# Altium integrated library LEMO Unipole And Multipole Type Connectors.IntLib: 1566 symbols (part 3 of 13) (continued)
## EEA.2B.304.CLN
designator J?
Fixed receptacle, nut fixing with straight contacts for printed circuit(back panel mounting), Key (A), 2B series, Multipole Type with 4 Contacts; Manufacturer: LEMO; PartNumber: EEA.2B.304.CLN; Number of contacts: 4; Contact Diameter: 1.3 mm; AWG: 20; Rated Current(A): 15; DatasheetVersion: Jun-14; PackageReference: EEA.2B.304.CLN; PackageDescription: Fixed receptacle, nut fixing with straight contacts for printed circuit(back panel mounting), Key(A) for Printed Circuit; ComponentLink1Description: Manufacturer URL; ComponentLink1URL: http://www.lemo.com; ComponentLink2Description: Datasheet; ComponentLink2URL: http://intra.lemo.ch/catalog/ROW/UK_English/unipole_multipole.pdf
footprint EEA.2B.304.CLN (Socket, Female, Body 15mm dia. Height 24.6 mm, Through hole)
pins: 1, 2, 3, 4

## EEA.2B.304.CLV
designator J?
Fixed receptacle, nut fixing with elbow contacts for printed circuit(back panel mounting), Key (A), 2B series, Multipole Type with 4 Contacts; Manufacturer: LEMO; PartNumber: EEA.2B.304.CLV; Number of contacts: 4; Contact Diameter: 1.3 mm; AWG: 20; Rated Current(A): 0; DatasheetVersion: Jun-14; PackageReference: EEA.2B.304.CLV; PackageDescription: Fixed receptacle, nut fixing with elbow contacts for printed circuit(back panel mounting), Key(A) for Printed Circuit; ComponentLink1Description: Manufacturer URL; ComponentLink1URL: http://www.lemo.com; ComponentLink2Description: Datasheet; ComponentLink2URL: http://intra.lemo.ch/catalog/ROW/UK_English/unipole_multipole.pdf
footprint EEA.2B.304.CLV (Socket, Female, Body 15mm dia. Height 24.6 mm, Through hole)
pins: 1, 2, 3, 4

## EEA.2B.308.CLN
designator J?
Fixed receptacle, nut fixing with straight contacts for printed circuit(back panel mounting), Key (A), 2B series, Multipole Type with 8 Contacts; Manufacturer: LEMO; PartNumber: EEA.2B.308.CLN; Number of contacts: 8; Contact Diameter: 0.9 mm; AWG: 22; Rated Current(A): 10; DatasheetVersion: Jun-14; PackageReference: EEA.2B.308.CLN; PackageDescription: Fixed receptacle, nut fixing with straight contacts for printed circuit(back panel mounting), Key(A) for Printed Circuit; Supplier 1: Mouser; Supplier Part Number 1: 736-EEA2B308CLN; Supplier 2: Digi-Key; Supplier Part Number 2: EEA.2B.308.CLN-ND; ComponentLink1Description: Manufacturer URL; ComponentLink1URL: http://www.lemo.com; ComponentLink2Description: Datasheet; ComponentLink2URL: http://intra.lemo.ch/catalog/ROW/UK_English/unipole_multipole.pdf
footprint EEA.2B.308.CLN (Socket, Female, Body 15mm dia. Height 24.6 mm, Through hole)
pins: 1, 2, 3, 4, 5, 6, 7, 8

## EEA.2B.310.CLN
designator J?
Fixed receptacle, nut fixing with straight contacts for printed circuit(back panel mounting), Key (A), 2B series, Multipole Type with 10 Contacts; Manufacturer: LEMO; PartNumber: EEA.2B.310.CLN; Number of contacts: 10; Contact Diameter: 0.9 mm; AWG: 22; Rated Current(A): 8; DatasheetVersion: Jun-14; PackageReference: EEA.2B.310.CLN; PackageDescription: Fixed receptacle, nut fixing with straight contacts for printed circuit(back panel mounting), Key(A) for Printed Circuit; ComponentLink1Description: Manufacturer URL; ComponentLink1URL: http://www.lemo.com; ComponentLink2Description: Datasheet; ComponentLink2URL: http://intra.lemo.ch/catalog/ROW/UK_English/unipole_multipole.pdf
footprint EEA.2B.310.CLN (Socket, Female, Body 15mm dia. Height 24.6 mm, Through hole)
pins: 1, 2, 3, 4, 5, 6, 7, 8, 9, 10

## EEA.2B.312.CLN
designator J?
Fixed receptacle, nut fixing with straight contacts for printed circuit(back panel mounting), Key (A), 2B series, Multipole Type with 12 Contacts; Manufacturer: LEMO; PartNumber: EEA.2B.312.CLN; Number of contacts: 12; Contact Diameter: 0.7 mm; AWG: 24; Rated Current(A): 7; DatasheetVersion: Jun-14; PackageReference: EEA.2B.312.CLN; PackageDescription: Fixed receptacle, nut fixing with straight contacts for printed circuit(back panel mounting), Key(A) for Printed Circuit; Supplier 1: Mouser; Supplier Part Number 1: 736-EEA2B312CLN; Supplier 2: Digi-Key; Supplier Part Number 2: EEA.2B.312.CLN-ND; ComponentLink1Description: Manufacturer URL; ComponentLink1URL: http://www.lemo.com; ComponentLink2Description: Datasheet; ComponentLink2URL: http://intra.lemo.ch/catalog/ROW/UK_English/unipole_multipole.pdf
footprint EEA.2B.312.CLN (Socket, Female, Body 15mm dia. Height 24.6 mm, Through hole)
pins: 1, 2, 3, 4, 5, 6, 7, 8, 9, 10, 11, 12

## EEA.2B.314.CLN
designator J?
Fixed receptacle, nut fixing with straight contacts for printed circuit(back panel mounting), Key (A), 2B series, Multipole Type with 14 Contacts; Manufacturer: LEMO; PartNumber: EEA.2B.314.CLN; Number of contacts: 14; Contact Diameter: 0.7 mm; AWG: 24; Rated Current(A): 6.5; DatasheetVersion: Jun-14; PackageReference: EEA.2B.314.CLN; PackageDescription: Fixed receptacle, nut fixing with straight contacts for printed circuit(back panel mounting), Key(A) for Printed Circuit; Supplier 1: Mouser; Supplier Part Number 1: 736-EEA2B314CLN; Supplier 2: Digi-Key; Supplier Part Number 2: EEA.2B.314.CLN-ND; ComponentLink1Description: Manufacturer URL; ComponentLink1URL: http://www.lemo.com; ComponentLink2Description: Datasheet; ComponentLink2URL: http://intra.lemo.ch/catalog/ROW/UK_English/unipole_multipole.pdf
footprint EEA.2B.314.CLN (Socket, Female, Body 15mm dia. Height 24.6 mm, Through hole)
pins: 1, 2, 3, 4, 5, 6, 7, 8, 9, 10, 11, 12, 13, 14

## EEA.2B.316.CLN
designator J?
Fixed receptacle, nut fixing with straight contacts for printed circuit(back panel mounting), Key (A), 2B series, Multipole Type with 16 Contacts; Manufacturer: LEMO; PartNumber: EEA.2B.316.CLN; Number of contacts: 16; Contact Diameter: 0.7 mm; AWG: 24; Rated Current(A): 6; DatasheetVersion: Jun-14; PackageReference: EEA.2B.316.CLN; PackageDescription: Fixed receptacle, nut fixing with straight contacts for printed circuit(back panel mounting), Key(A) for Printed Circuit; Supplier 1: Mouser; Supplier Part Number 1: 736-EEA2B316CLN; Supplier 2: Digi-Key; Supplier Part Number 2: EEA.2B.316.CLN-ND; ComponentLink1Description: Manufacturer URL; ComponentLink1URL: http://www.lemo.com; ComponentLink2Description: Datasheet; ComponentLink2URL: http://intra.lemo.ch/catalog/ROW/UK_English/unipole_multipole.pdf
footprint EEA.2B.316.CLN (Socket, Female, Body 15mm dia. Height 24.6 mm, Through hole)
pins: 1, 2, 3, 4, 5, 6

## EEA.2B.319.CLN
designator J?
Fixed receptacle, nut fixing with straight contacts for printed circuit(back panel mounting), Key (A), 2B series, Multipole Type with 19 Contacts; Manufacturer: LEMO; PartNumber: EEA.2B.319.CLN; Number of contacts: 19; Contact Diameter: 0.7 mm; AWG: 24; Rated Current(A): 5; DatasheetVersion: Jun-14; PackageReference: EEA.2B.319.CLN; PackageDescription: Fixed receptacle, nut fixing with straight contacts for printed circuit(back panel mounting), Key(A) for Printed Circuit; Supplier 1: Mouser; Supplier Part Number 1: 736-EEA2B319CLN; Supplier 2: Digi-Key; Supplier Part Number 2: EEA.2B.319.CLN-ND; ComponentLink1Description: Manufacturer URL; ComponentLink1URL: http://www.lemo.com; ComponentLink2Description: Datasheet; ComponentLink2URL: http://intra.lemo.ch/catalog/ROW/UK_English/unipole_multipole.pdf
footprint EEA.2B.319.CLN (Socket, Female, Body 15mm dia. Height 24.6 mm, Through hole)
pins: 1, 2, 3, 4, 5, 6, 7, 8, 9, 10, 11, 12, 13, 14, 15, 16, 17, 18, 19

## EEA.2K.305.CLN
designator J?
Fixed receptacle, nut fixing, with straight contacts for printed circuit (back panel mounting), Key (A), 2K series, Multipole Type with 5 Contacts; Manufacturer: LEMO; PartNumber: EEA.2K.305.CLN; Number of contacts: 5; Contact Diameter: 1.3 mm; AWG: 20; Rated Current(A): 14; DatasheetVersion: Jun-14; PackageReference: EEA.2K.305.CLN; PackageDescription: Fixed receptacle, nut fixing, with straight contacts for printed circuit (back panel mounting), Key(A) for Printed Circuit; ComponentLink1Description: Manufacturer URL; ComponentLink1URL: http://www.lemo.com; ComponentLink2Description: Datasheet; ComponentLink2URL: http://intra.lemo.ch/catalog/ROW/UK_English/unipole_multipole.pdf
footprint EEA.2K.305.CLN (Socket, Female, Body 20mm dia. Height 25.8 mm, Through hole)
pins: 1, 2, 3, 4, 5

## EEA.2K.307.CLN
designator J?
Fixed receptacle, nut fixing, with straight contacts for printed circuit (back panel mounting), Key (A), 2K series, Multipole Type with 7 Contacts; Manufacturer: LEMO; PartNumber: EEA.2K.307.CLN; Number of contacts: 7; Contact Diameter: 1.3 mm; AWG: 20; Rated Current(A): 11; DatasheetVersion: Jun-14; PackageReference: EEA.2K.307.CLN; PackageDescription: Fixed receptacle, nut fixing, with straight contacts for printed circuit (back panel mounting), Key(A) for Printed Circuit; ComponentLink1Description: Manufacturer URL; ComponentLink1URL: http://www.lemo.com; ComponentLink2Description: Datasheet; ComponentLink2URL: http://intra.lemo.ch/catalog/ROW/UK_English/unipole_multipole.pdf
footprint EEA.2K.307.CLN (Socket, Female, Body 20mm dia. Height 25.8 mm, Through hole)
pins: 1, 2, 3, 4, 5, 6, 7

## EEA.2K.312.CLN
designator J?
Fixed receptacle, nut fixing, with straight contacts for printed circuit (back panel mounting), Key (A), 2K series, Multipole Type with 12 Contacts; Manufacturer: LEMO; PartNumber: EEA.2K.312.CLN; Number of contacts: 12; Contact Diameter: 0.7 mm; AWG: 24; Rated Current(A): 7; DatasheetVersion: Jun-14; PackageReference: EEA.2K.312.CLN; PackageDescription: Fixed receptacle, nut fixing, with straight contacts for printed circuit (back panel mounting), Key(A) for Printed Circuit; ComponentLink1Description: Manufacturer URL; ComponentLink1URL: http://www.lemo.com; ComponentLink2Description: Datasheet; ComponentLink2URL: http://intra.lemo.ch/catalog/ROW/UK_English/unipole_multipole.pdf
footprint EEA.2K.312.CLN (Socket, Female, Body 20mm dia. Height 25.8 mm, Through hole)
pins: 1, 2, 3, 4, 5, 6, 7, 8, 9, 10, 11, 12

## EEA.2K.318.CLN
designator J?
Fixed receptacle, nut fixing, with straight contacts for printed circuit (back panel mounting), Key (A), 2K series, Multipole Type with 18 Contacts; Manufacturer: LEMO; PartNumber: EEA.2K.318.CLN; Number of contacts: 18; Contact Diameter: 0.7 mm; AWG: 24; Rated Current(A): 5.5; DatasheetVersion: Jun-14; PackageReference: EEA.2K.318.CLN; PackageDescription: Fixed receptacle, nut fixing, with straight contacts for printed circuit (back panel mounting), Key(A) for Printed Circuit; ComponentLink1Description: Manufacturer URL; ComponentLink1URL: http://www.lemo.com; ComponentLink2Description: Datasheet; ComponentLink2URL: http://intra.lemo.ch/catalog/ROW/UK_English/unipole_multipole.pdf
footprint EEA.2K.318.CLN (Socket, Female, Body 20mm dia. Height 25.8 mm, Through hole)
pins: 1, 2, 3, 4, 5, 6, 7, 8, 9, 10, 11, 12, 13, 14, 15, 16, 17, 18

## EEA.3B.318.CLN
designator J?
Fixed receptacle, nut fixing with straight contacts for printed circuit(back panel mounting), Key (A), 3B series, Multipole Type with 18 Contacts; Manufacturer: LEMO; PartNumber: EEA.3B.318.CLN; Number of contacts: 18; Contact Diameter: 0.9 mm; AWG: 22; Rated Current(A): 7; DatasheetVersion: Jun-14; PackageReference: EEA.3B.318.CLN; PackageDescription: Fixed receptacle, nut fixing with straight contacts for printed circuit(back panel mounting), Key(A) for Printed Circuit; Supplier 1: Mouser; Supplier Part Number 1: 736-EEA3B318CLN; Supplier 2: Digi-Key; Supplier Part Number 2: EEA.3B.318.CLN-ND; ComponentLink1Description: Manufacturer URL; ComponentLink1URL: http://www.lemo.com; ComponentLink2Description: Datasheet; ComponentLink2URL: http://intra.lemo.ch/catalog/ROW/UK_English/unipole_multipole.pdf
footprint EEA.3B.318.CLN (Socket, Female, Body 18mm dia. Height 28.1 mm, Through hole)
pins: 1, 2, 3, 4, 5, 6, 7, 8, 9, 10, 11, 12, 13, 14, 15, 16, 17, 18

## EEA.3B.320.CLN
designator J?
Fixed receptacle, nut fixing with straight contacts for printed circuit(back panel mounting), Key (A), 3B series, Multipole Type with 20 Contacts; Manufacturer: LEMO; PartNumber: EEA.3B.320.CLN; Number of contacts: 20; Contact Diameter: 0.7 mm; AWG: 24; Rated Current(A): 6; DatasheetVersion: Jun-14; PackageReference: EEA.3B.320.CLN; PackageDescription: Fixed receptacle, nut fixing with straight contacts for printed circuit(back panel mounting), Key(A) for Printed Circuit; Supplier 1: Mouser; Supplier Part Number 1: 736-EEA3B320CLN; Supplier 2: Digi-Key; Supplier Part Number 2: EEA.3B.320.CLN-ND; ComponentLink1Description: Manufacturer URL; ComponentLink1URL: http://www.lemo.com; ComponentLink2Description: Datasheet; ComponentLink2URL: http://intra.lemo.ch/catalog/ROW/UK_English/unipole_multipole.pdf
footprint EEA.3B.320.CLN (Socket, Female, Body 18mm dia. Height 28.1 mm, Through hole)
pins: 1, 2, 3, 4, 5, 6, 7, 8, 9, 10, 11, 12, 13, 14, 15, 16, 17, 18, 19, 20

## EEA.3K.308.CLN
designator J?
Fixed receptacle, nut fixing, with straight contacts for printed circuit (back panel mounting), Key (A), 3K series, Multipole Type with 8 Contacts; Manufacturer: LEMO; PartNumber: EEA.3K.308.CLN; Number of contacts: 8; Contact Diameter: 1.3 mm; AWG: 20; Rated Current(A): 13; DatasheetVersion: Jun-14; PackageReference: EEA.3K.308.CLN; PackageDescription: Fixed receptacle, nut fixing, with straight contacts for printed circuit (back panel mounting), Key(A) for Printed Circuit; ComponentLink1Description: Manufacturer URL; ComponentLink1URL: http://www.lemo.com; ComponentLink2Description: Datasheet; ComponentLink2URL: http://intra.lemo.ch/catalog/ROW/UK_English/unipole_multipole.pdf
footprint EEA.3K.308.CLN (Socket, Female, Body 24mm dia. Height 31.3 mm, Through hole)
pins: 1, 2, 3, 4, 5, 6, 7, 8

## EEB.0B.305.CLN
designator J?
Fixed receptacle, nut fixing with straight contacts for printed circuit(back panel mounting), Key (B), 0B series, Multipole Type with 5 Contacts; Manufacturer: LEMO; PartNumber: EEB.0B.305.CLN; Number of contacts: 5; Contact Diameter: 0.7 mm; AWG: 24; Rated Current(A): 6.5; DatasheetVersion: Jun-14; PackageReference: EEB.0B.305.CLN; PackageDescription: Fixed receptacle, nut fixing with straight contacts for printed circuit(back panel mounting), Key(B) for Printed Circuit; Supplier 1: Mouser; Supplier Part Number 1: 736-EEB0B305CLN; Supplier 2: Digi-Key; Supplier Part Number 2: EEB.0B.305.CLN-ND; ComponentLink1Description: Manufacturer URL; ComponentLink1URL: http://www.lemo.com; ComponentLink2Description: Datasheet; ComponentLink2URL: http://intra.lemo.ch/catalog/ROW/UK_English/unipole_multipole.pdf
footprint EEB.0B.305.CLN (Socket, Female, Body 9mm dia. Height 16.3 mm, Through hole)
pins: 1, 2, 3, 4, 5

## EEB.0B.305.CLV
designator J?
Fixed receptacle, nut fixing with elbow contacts for printed circuit(back panel mounting), Key (B), 0B series, Multipole Type with 5 Contacts; Manufacturer: LEMO; PartNumber: EEB.0B.305.CLV; Number of contacts: 5; Contact Diameter: 0.7 mm; AWG: 24; Rated Current(A): 6; DatasheetVersion: Jun-14; PackageReference: EEB.0B.305.CLV; PackageDescription: Fixed receptacle, nut fixing with elbow contacts for printed circuit(back panel mounting), Key(B) for Printed Circuit; ComponentLink1Description: Manufacturer URL; ComponentLink1URL: http://www.lemo.com; ComponentLink2Description: Datasheet; ComponentLink2URL: http://intra.lemo.ch/catalog/ROW/UK_English/unipole_multipole.pdf
footprint EEB.0B.305.CLV (Socket, Female, Body 9mm dia. Height 19.1 mm, Through hole)
pins: 1, 2, 3, 4, 5

## EEB.0K.307.CLN
designator J?
Fixed receptacle, nut fixing, with straight contacts for printed circuit (back panel mounting), Key (B), 0K series, Multipole Type with 7 Contacts; Manufacturer: LEMO; PartNumber: EEB.0K.307.CLN; Number of contacts: 7; Contact Diameter: 0.5 mm; AWG: 28; Rated Current(A): 2.5; DatasheetVersion: Jun-14; PackageReference: EEB.0K.307.CLN; PackageDescription: Fixed receptacle, nut fixing, with straight contacts for printed circuit (back panel mounting), Key(B) for Printed Circuit; Supplier 1: Mouser; Supplier Part Number 1: 736-EEB0K307CLN; Supplier 2: Digi-Key; Supplier Part Number 2: EEB.0K.307.CLN-ND; ComponentLink1Description: Manufacturer URL; ComponentLink1URL: http://www.lemo.com; ComponentLink2Description: Datasheet; ComponentLink2URL: http://intra.lemo.ch/catalog/ROW/UK_English/unipole_multipole.pdf
footprint EEB.0K.307.CLN (Socket, Female, Body 14mm dia. Height 17.6 mm, Through hole)
pins: 1, 2, 3, 4, 5, 6, 7

## EEB.1B.303.CLV
designator J?
Fixed receptacle, nut fixing with elbow contacts for printed circuit(back panel mounting), Key (B), 1B series, Multipole Type with 3 Contacts; Manufacturer: LEMO; PartNumber: EEB.1B.303.CLV; Number of contacts: 3; Contact Diameter: 1.3 mm; AWG: 20; Rated Current(A): 0; DatasheetVersion: Jun-14; PackageReference: EEB.1B.303.CLV; PackageDescription: Fixed receptacle, nut fixing with elbow contacts for printed circuit(back panel mounting), Key(B) for Printed Circuit; Supplier 1: Mouser; Supplier Part Number 1: 736-EEB1B303CLV; Supplier 2: Digi-Key; Supplier Part Number 2: EEB.1B.303.CLV-ND; ComponentLink1Description: Manufacturer URL; ComponentLink1URL: http://www.lemo.com; ComponentLink2Description: Datasheet; ComponentLink2URL: http://intra.lemo.ch/catalog/ROW/UK_English/unipole_multipole.pdf
footprint EEB.1B.303.CLV (Socket, Female, Body 12mm dia. Height 21.1 mm, Through hole)
pins: 1, 2, 3

## EEB.1B.310.CLN
designator J?
Fixed receptacle, nut fixing with straight contacts for printed circuit(back panel mounting), Key (B), 1B series, Multipole Type with 10 Contacts; Manufacturer: LEMO; PartNumber: EEB.1B.310.CLN; Number of contacts: 10; Contact Diameter: 0.5 mm; AWG: 28; Rated Current(A): 2.5; DatasheetVersion: Jun-14; PackageReference: EEB.1B.310.CLN; PackageDescription: Fixed receptacle, nut fixing with straight contacts for printed circuit(back panel mounting), Key(B) for Printed Circuit; Supplier 1: Mouser; Supplier Part Number 1: 736-EEB1B310CLN; Supplier 2: Digi-Key; Supplier Part Number 2: EEB.1B.310.CLN-ND; ComponentLink1Description: Manufacturer URL; ComponentLink1URL: http://www.lemo.com; ComponentLink2Description: Datasheet; ComponentLink2URL: http://intra.lemo.ch/catalog/ROW/UK_English/unipole_multipole.pdf
footprint EEB.1B.310.CLN (Socket, Female, Body 12mm dia. Height 21.1 mm, Through hole)
pins: 1, 2, 3, 4, 5, 6, 7, 8, 9, 10

## EEB.1K.307.CLN
designator J?
Fixed receptacle, nut fixing, with straight contacts for printed circuit (back panel mounting), Key (B), 1K series, Multipole Type with 7 Contacts; Manufacturer: LEMO; PartNumber: EEB.1K.307.CLN; Number of contacts: 7; Contact Diameter: 0.7 mm; AWG: 24; DatasheetVersion: Jun-14; PackageReference: EEB.1K.307.CLN; PackageDescription: Fixed receptacle, nut fixing, with straight contacts for printed circuit (back panel mounting), Key(B) for Printed Circuit; Rated Current(A): 7; ComponentLink1Description: Manufacturer URL; ComponentLink1URL: http://www.lemo.com; ComponentLink2Description: Datasheet; ComponentLink2URL: http://intra.lemo.ch/catalog/ROW/UK_English/unipole_multipole.pdf
footprint EEB.1K.307.CLN (Socket, Female, Body 16mm dia., Through hole)
pins: 1, 2, 3, 4, 5, 6, 7

## EEB.2B.310.CLN
designator J?
Fixed receptacle, nut fixing with straight contacts for printed circuit(back panel mounting), Key (B), 2B series, Multipole Type with 10 Contacts; Manufacturer: LEMO; PartNumber: EEB.2B.310.CLN; Number of contacts: 10; Contact Diameter: 0.9 mm; AWG: 22; Rated Current(A): 8; DatasheetVersion: Jun-14; PackageReference: EEB.2B.310.CLN; PackageDescription: Fixed receptacle, nut fixing with straight contacts for printed circuit(back panel mounting), Key(B) for Printed Circuit; ComponentLink1Description: Manufacturer URL; ComponentLink1URL: http://www.lemo.com; ComponentLink2Description: Datasheet; ComponentLink2URL: http://intra.lemo.ch/catalog/ROW/UK_English/unipole_multipole.pdf
footprint EEB.2B.310.CLN (Socket, Female, Body 15mm dia. Height 24.6 mm, Through hole)
pins: 1, 2, 3, 4, 5, 6, 7, 8, 9, 10

## EEB.2K.307.CLN
designator J?
Fixed receptacle, nut fixing, with straight contacts for printed circuit (back panel mounting), Key (B), 2K series, Multipole Type with 7 Contacts; Manufacturer: LEMO; PartNumber: EEB.2K.307.CLN; Number of contacts: 7; Contact Diameter: 1.3 mm; AWG: 20; Rated Current(A): 11; DatasheetVersion: Jun-14; PackageReference: EEB.2K.307.CLN; PackageDescription: Fixed receptacle, nut fixing, with straight contacts for printed circuit (back panel mounting), Key(B) for Printed Circuit; ComponentLink1Description: Manufacturer URL; ComponentLink1URL: http://www.lemo.com; ComponentLink2Description: Datasheet; ComponentLink2URL: http://intra.lemo.ch/catalog/ROW/UK_English/unipole_multipole.pdf
footprint EEB.2K.307.CLN (Socket, Female, Body 20mm dia. Height 25.8 mm, Through hole)
pins: 1, 2, 3, 4, 5, 6, 7

## EEC.0B.304.CLV
designator J?
Fixed receptacle, nut fixing with elbow contacts for printed circuit(back panel mounting), Key (C), 0B series, Multipole Type with 4 Contacts; Manufacturer: LEMO; PartNumber: EEC.0B.304.CLV; Number of contacts: 4; Contact Diameter: 0.7 mm; AWG: 24; Rated Current(A): 6; DatasheetVersion: Jun-14; PackageReference: EEC.0B.304.CLV; PackageDescription: Fixed receptacle, nut fixing with elbow contacts for printed circuit(back panel mounting), Key(C) for Printed Circuit; ComponentLink1Description: Manufacturer URL; ComponentLink1URL: http://www.lemo.com; ComponentLink2Description: Datasheet; ComponentLink2URL: http://intra.lemo.ch/catalog/ROW/UK_English/unipole_multipole.pdf
footprint EEC.0B.304.CLV (Socket, Female, Body 9mm dia. Height 19.1 mm, Through hole)
pins: 1, 2, 3, 4

## EEC.0K.302.CLN
designator J?
Fixed receptacle, nut fixing, with straight contacts for printed circuit (back panel mounting), Key (C), 0K series, Multipole Type with 2 Contacts; Manufacturer: LEMO; PartNumber: EEC.0K.302.CLN; Number of contacts: 2; Contact Diameter: 0.9 mm; AWG: 22; Rated Current(A): 10; DatasheetVersion: Jun-14; PackageReference: EEC.0K.302.CLN; PackageDescription: Fixed receptacle, nut fixing, with straight contacts for printed circuit (back panel mounting), Key(C) for Printed Circuit; ComponentLink1Description: Manufacturer URL; ComponentLink1URL: http://www.lemo.com; ComponentLink2Description: Datasheet; ComponentLink2URL: http://intra.lemo.ch/catalog/ROW/UK_English/unipole_multipole.pdf
footprint EEC.0K.302.CLN (Socket, Female, Body 14mm dia. Height 17.6 mm, Through hole)
pins: 1, 2

## EEC.1B.305.CLN
designator J?
Fixed receptacle, nut fixing with straight contacts for printed circuit(back panel mounting), Key (C), 1B series, Multipole Type with 5 Contacts; Manufacturer: LEMO; PartNumber: EEC.1B.305.CLN; Number of contacts: 5; Contact Diameter: 0.9 mm; AWG: 22; Rated Current(A): 9; DatasheetVersion: Jun-14; PackageReference: EEC.1B.305.CLN; PackageDescription: Fixed receptacle, nut fixing with straight contacts for printed circuit(back panel mounting), Key(C) for Printed Circuit; ComponentLink1Description: Manufacturer URL; ComponentLink1URL: http://www.lemo.com; ComponentLink2Description: Datasheet; ComponentLink2URL: http://intra.lemo.ch/catalog/ROW/UK_English/unipole_multipole.pdf
footprint EEC.1B.305.CLN (Socket, Female, Body 12mm dia. Height 21.1 mm, Through hole)
pins: 1, 2, 3, 4, 5

## EEC.1K.308.CLN
designator J?
Fixed receptacle, nut fixing, with straight contacts for printed circuit (back panel mounting), Key (C), 1K series, Multipole Type with 8 Contacts; Manufacturer: LEMO; PartNumber: EEC.1K.308.CLN; Number of contacts: 8; Contact Diameter: 0.7 mm; AWG: 24; Rated Current(A): 5; DatasheetVersion: Jun-14; PackageReference: EEC.1K.308.CLN; PackageDescription: Fixed receptacle, nut fixing, with straight contacts for printed circuit (back panel mounting), Key(C) for Printed Circuit; ComponentLink1Description: Manufacturer URL; ComponentLink1URL: http://www.lemo.com; ComponentLink2Description: Datasheet; ComponentLink2URL: http://intra.lemo.ch/catalog/ROW/UK_English/unipole_multipole.pdf
footprint EEC.1K.308.CLN (Socket, Female, Body 16mm dia., Through hole)
pins: 1, 2, 3, 4, 5, 6, 7, 8

## EEC.1K.314.CLN
designator J?
Fixed receptacle, nut fixing, with straight contacts for printed circuit (back panel mounting), Key (C), 1K series, Multipole Type with 14 Contacts; Manufacturer: LEMO; PartNumber: EEC.1K.314.CLN; Number of contacts: 14; Contact Diameter: 0.5 mm; AWG: 28; Rated Current(A): 2; DatasheetVersion: Jun-14; PackageReference: EEC.1K.314.CLN; PackageDescription: Fixed receptacle, nut fixing, with straight contacts for printed circuit (back panel mounting), Key(C) for Printed Circuit; ComponentLink1Description: Manufacturer URL; ComponentLink1URL: http://www.lemo.com; ComponentLink2Description: Datasheet; ComponentLink2URL: http://intra.lemo.ch/catalog/ROW/UK_English/unipole_multipole.pdf
footprint EEC.1K.314.CLN (Socket, Female, Body 16mm dia., Through hole)
pins: 1, 2, 3, 4, 5, 6, 7, 8, 9, 10, 11, 12, 13, 14

## EEC.2B.303.CLN
designator J?
Fixed receptacle, nut fixing with straight contacts for printed circuit(back panel mounting), Key (C), 2B series, Multipole Type with 3 Contacts; Manufacturer: LEMO; PartNumber: EEC.2B.303.CLN; Number of contacts: 3; Contact Diameter: 1.6 mm; AWG: 16; Rated Current(A): 17; DatasheetVersion: Jun-14; PackageReference: EEC.2B.303.CLN; PackageDescription: Fixed receptacle, nut fixing with straight contacts for printed circuit(back panel mounting), Key(C) for Printed Circuit; Supplier 1: Mouser; Supplier Part Number 1: 736-EEC2B303CLN; Supplier 2: Digi-Key; Supplier Part Number 2: EEC.2B.303.CLN-ND; ComponentLink1Description: Manufacturer URL; ComponentLink1URL: http://www.lemo.com; ComponentLink2Description: Datasheet; ComponentLink2URL: http://intra.lemo.ch/catalog/ROW/UK_English/unipole_multipole.pdf
footprint EEC.2B.303.CLN (Socket, Female, Body 15mm dia. Height 24.6 mm, Through hole)
pins: 1, 2, 3

## EEC.2B.306.CLN
designator J?
Fixed receptacle, nut fixing with straight contacts for printed circuit(back panel mounting), Key (C), 2B series, Multipole Type with 6 Contacts; Manufacturer: LEMO; PartNumber: EEC.2B.306.CLN; Number of contacts: 6; Contact Diameter: 1.3 mm; AWG: 20; Rated Current(A): 12; DatasheetVersion: Jun-14; PackageReference: EEC.2B.306.CLN; PackageDescription: Fixed receptacle, nut fixing with straight contacts for printed circuit(back panel mounting), Key(C) for Printed Circuit; Supplier 1: Mouser; Supplier Part Number 1: 736-EEC2B306CLN; Supplier 2: Digi-Key; Supplier Part Number 2: EEC.2B.306.CLN-ND; ComponentLink1Description: Manufacturer URL; ComponentLink1URL: http://www.lemo.com; ComponentLink2Description: Datasheet; ComponentLink2URL: http://intra.lemo.ch/catalog/ROW/UK_English/unipole_multipole.pdf
footprint EEC.2B.306.CLN (Socket, Female, Body 15mm dia. Height 24.6 mm, Through hole)
pins: 1, 2, 3, 4, 5, 6

## EEC.2B.314.CLN
designator J?
Fixed receptacle, nut fixing with straight contacts for printed circuit(back panel mounting), Key (C), 2B series, Multipole Type with 14 Contacts; Manufacturer: LEMO; PartNumber: EEC.2B.314.CLN; Number of contacts: 14; Contact Diameter: 0.7 mm; AWG: 24; Rated Current(A): 6.5; DatasheetVersion: Jun-14; PackageReference: EEC.2B.314.CLN; PackageDescription: Fixed receptacle, nut fixing with straight contacts for printed circuit(back panel mounting), Key(C) for Printed Circuit; Supplier 1: Mouser; Supplier Part Number 1: 736-EEC2B314CLN; Supplier 2: Digi-Key; Supplier Part Number 2: EEC.2B.314.CLN-ND; ComponentLink1Description: Manufacturer URL; ComponentLink1URL: http://www.lemo.com; ComponentLink2Description: Datasheet; ComponentLink2URL: http://intra.lemo.ch/catalog/ROW/UK_English/unipole_multipole.pdf
footprint EEC.2B.314.CLN (Socket, Female, Body 15mm dia. Height 24.6 mm, Through hole)
pins: 1, 2, 3, 4, 5, 6, 7, 8, 9, 10, 11, 12, 13, 14

## EEC.2K.316.CLN
designator J?
Fixed receptacle, nut fixing, with straight contacts for printed circuit (back panel mounting), Key (C), 2K series, Multipole Type with 16 Contacts; Manufacturer: LEMO; PartNumber: EEC.2K.316.CLN; Number of contacts: 16; Contact Diameter: 0.7 mm; AWG: 24; Rated Current(A): 6; DatasheetVersion: Jun-14; PackageReference: EEC.2K.316.CLN; PackageDescription: Fixed receptacle, nut fixing, with straight contacts for printed circuit (back panel mounting), Key(C) for Printed Circuit; ComponentLink1Description: Manufacturer URL; ComponentLink1URL: http://www.lemo.com; ComponentLink2Description: Datasheet; ComponentLink2URL: http://intra.lemo.ch/catalog/ROW/UK_English/unipole_multipole.pdf
footprint EEC.2K.316.CLN (Socket, Female, Body 20mm dia. Height 25.8 mm, Through hole)
pins: 1, 2, 3, 4, 5, 6, 7, 8, 9, 10, 11, 12, 13, 14, 15, 16

## EEC.4K.316.CLN
designator J?
Fixed receptacle, nut fixing (back panel mounting), Key (C), 4K series, Multipole Type with 16 Contacts; Manufacturer: LEMO; PartNumber: EEC.4K.316.CLN; Number of contacts: 16; Contact Diameter: 0.9 mm; AWG: 22; Rated Current(A): 10; DatasheetVersion: Jun-14; PackageReference: EEC.4K.316.CLN; PackageDescription: Fixed receptacle, nut fixing (back panel mounting), Key(C) for Printed Circuit; ComponentLink1Description: Manufacturer URL; ComponentLink1URL: http://www.lemo.com; ComponentLink2Description: Datasheet; ComponentLink2URL: http://intra.lemo.ch/catalog/ROW/UK_English/unipole_multipole.pdf
footprint EEC.4K.316.CLN (Socket, Female, Body 30mm dia., Through hole)
pins: 1, 2, 3, 4, 5, 6, 7, 8, 9, 10, 11, 12, 13, 14, 15, 16

## EED.1B.307.CLN
designator J?
Fixed receptacle, nut fixing with straight contacts for printed circuit(back panel mounting), Key (D), 1B series, Multipole Type with 7 Contacts; Manufacturer: LEMO; PartNumber: EED.1B.307.CLN; Number of contacts: 7; Contact Diameter: 0.7 mm; AWG: 24; DatasheetVersion: Jun-14; PackageReference: EED.1B.307.CLN; PackageDescription: Fixed receptacle, nut fixing with straight contacts for printed circuit(back panel mounting), Key(D) for Printed Circuit; Supplier 1: Mouser; Supplier Part Number 1: 736-EED1B307CLN; Supplier 2: Digi-Key; Supplier Part Number 2: EED.1B.307.CLN-ND; Rated Current(A): 7; ComponentLink1Description: Manufacturer URL; ComponentLink1URL: http://www.lemo.com; ComponentLink2Description: Datasheet; ComponentLink2URL: http://intra.lemo.ch/catalog/ROW/UK_English/unipole_multipole.pdf
footprint EED.1B.307.CLN (Socket, Female, Body 12mm dia. Height 21.1 mm, Through hole)
pins: 1, 2, 3, 4, 5, 6, 7

## EED.2B.306.CLN
designator J?
Fixed receptacle, nut fixing with straight contacts for printed circuit(back panel mounting), Key (D), 2B series, Multipole Type with 6 Contacts; Manufacturer: LEMO; PartNumber: EED.2B.306.CLN; Number of contacts: 6; Contact Diameter: 1.3 mm; AWG: 20; Rated Current(A): 12; DatasheetVersion: Jun-14; PackageReference: EED.2B.306.CLN; PackageDescription: Fixed receptacle, nut fixing with straight contacts for printed circuit(back panel mounting), Key(D) for Printed Circuit; ComponentLink1Description: Manufacturer URL; ComponentLink1URL: http://www.lemo.com; ComponentLink2Description: Datasheet; ComponentLink2URL: http://intra.lemo.ch/catalog/ROW/UK_English/unipole_multipole.pdf
footprint EED.2B.306.CLN (Socket, Female, Body 15mm dia. Height 24.6 mm, Through hole)
pins: 1, 2, 3, 4, 5, 6

## EED.2K.310.CLN
designator J?
Fixed receptacle, nut fixing, with straight contacts for printed circuit (back panel mounting), Key (D), 2K series, Multipole Type with 10 Contacts; Manufacturer: LEMO; PartNumber: EED.2K.310.CLN; Number of contacts: 10; Contact Diameter: 0.9 mm; AWG: 22; Rated Current(A): 8; DatasheetVersion: Jun-14; PackageReference: EED.2K.310.CLN; PackageDescription: Fixed receptacle, nut fixing, with straight contacts for printed circuit (back panel mounting), Key(D) for Printed Circuit; ComponentLink1Description: Manufacturer URL; ComponentLink1URL: http://www.lemo.com; ComponentLink2Description: Datasheet; ComponentLink2URL: http://intra.lemo.ch/catalog/ROW/UK_English/unipole_multipole.pdf
footprint EED.2K.310.CLN (Socket, Female, Body 20mm dia. Height 25.8 mm, Through hole)
pins: 1, 2, 3, 4, 5, 6, 7, 8, 9, 10
